# Altium footprint library smd-ipc.PCBLIB: 363 footprints (part 17 of 27)
Each footprint in its own frame and in the unit in brackets; x right, y up, seen from the top. Pads: shape width x height; smd on the part's side, far side on the other; paste and mask are expansions set on the pad; w line width, h text height; cw(c..) or ccw(c..) is an arc to the next point about the centre after c.
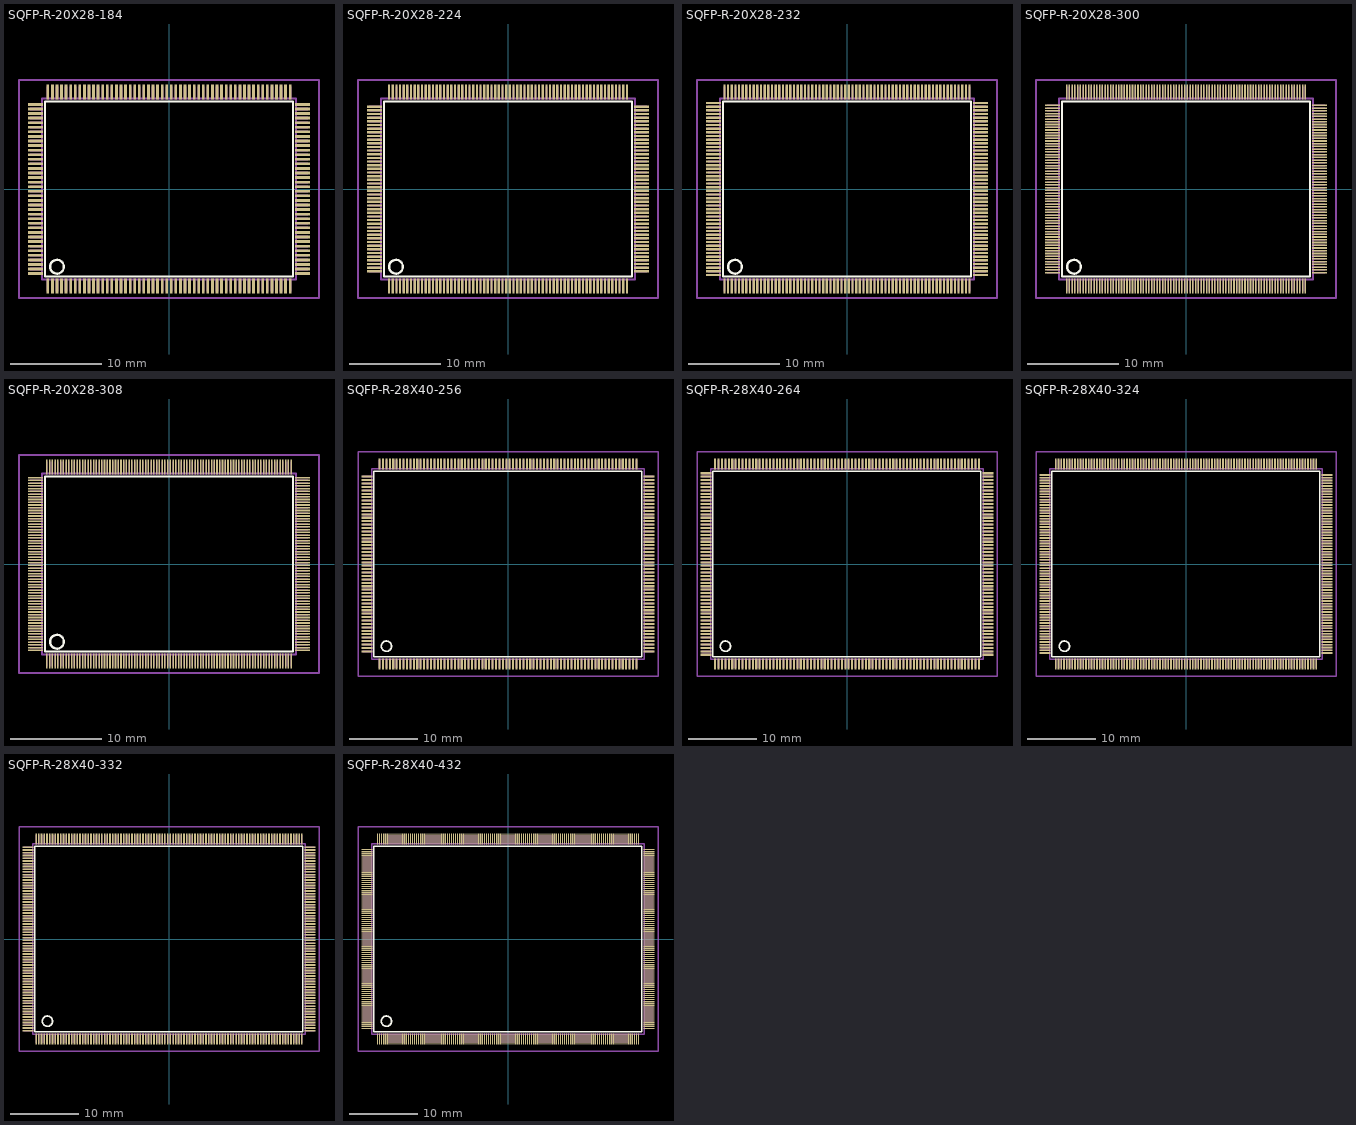
[diagram p16: the footprints below, top view; thin cyan lines are the x and y axes]

## SQFP-R-20X28-184 [mm]
pads (184):
  rect 0.3x1.6 smd: 1(-13.25,-10.6) 2(-12.75,-10.6) 3(-12.25,-10.6) 4(-11.75,-10.6) 5(-11.25,-10.6) 6(-10.75,-10.6) 7(-10.25,-10.6) 8(-9.75,-10.6) 9(-9.25,-10.6) 10(-8.75,-10.6) 11(-8.25,-10.6) 12(-7.75,-10.6) 13(-7.25,-10.6) 14(-6.75,-10.6) 15(-6.25,-10.6) 16(-5.75,-10.6) 17(-5.25,-10.6) 18(-4.75,-10.6) 19(-4.25,-10.6) 20(-3.75,-10.6) 21(-3.25,-10.6) 22(-2.75,-10.6) 23(-2.25,-10.6) 24(-1.75,-10.6) 25(-1.25,-10.6) 26(-0.75,-10.6) 27(-0.25,-10.6) 28(0.25,-10.6) 29(0.75,-10.6) 30(1.25,-10.6) 31(1.75,-10.6) 32(2.25,-10.6) 33(2.75,-10.6) 34(3.25,-10.6) 35(3.75,-10.6) 36(4.25,-10.6) 37(4.75,-10.6) 38(5.25,-10.6) 39(5.75,-10.6) 40(6.25,-10.6) 41(6.75,-10.6) 42(7.25,-10.6) 43(7.75,-10.6) 44(8.25,-10.6) 45(8.75,-10.6) 46(9.25,-10.6) 47(9.75,-10.6) 48(10.25,-10.6) 49(10.75,-10.6) 50(11.25,-10.6) 51(11.75,-10.6) 52(12.25,-10.6) 53(12.75,-10.6) 54(13.25,-10.6) 93(13.25,10.6) 94(12.75,10.6) 95(12.25,10.6) 96(11.75,10.6) 97(11.25,10.6) 98(10.75,10.6) 99(10.25,10.6) 100(9.75,10.6) 101(9.25,10.6) 102(8.75,10.6) 103(8.25,10.6) 104(7.75,10.6) 105(7.25,10.6) 106(6.75,10.6) 107(6.25,10.6) 108(5.75,10.6) 109(5.25,10.6) 110(4.75,10.6) 111(4.25,10.6) 112(3.75,10.6) 113(3.25,10.6) 114(2.75,10.6) 115(2.25,10.6) 116(1.75,10.6) 117(1.25,10.6) 118(0.75,10.6) 119(0.25,10.6) 120(-0.25,10.6) 121(-0.75,10.6) 122(-1.25,10.6) 123(-1.75,10.6) 124(-2.25,10.6) 125(-2.75,10.6) 126(-3.25,10.6) 127(-3.75,10.6) 128(-4.25,10.6) 129(-4.75,10.6) 130(-5.25,10.6) 131(-5.75,10.6) 132(-6.25,10.6) 133(-6.75,10.6) 134(-7.25,10.6) 135(-7.75,10.6) 136(-8.25,10.6) 137(-8.75,10.6) 138(-9.25,10.6) 139(-9.75,10.6) 140(-10.25,10.6) 141(-10.75,10.6) 142(-11.25,10.6) 143(-11.75,10.6) 144(-12.25,10.6) 145(-12.75,10.6) 146(-13.25,10.6)
  rect 1.6x0.3 smd: 55(14.6,-9.25) 56(14.6,-8.75) 57(14.6,-8.25) 58(14.6,-7.75) 59(14.6,-7.25) 60(14.6,-6.75) 61(14.6,-6.25) 62(14.6,-5.75) 63(14.6,-5.25) 64(14.6,-4.75) 65(14.6,-4.25) 66(14.6,-3.75) 67(14.6,-3.25) 68(14.6,-2.75) 69(14.6,-2.25) 70(14.6,-1.75) 71(14.6,-1.25) 72(14.6,-0.75) 73(14.6,-0.25) 74(14.6,0.25) 75(14.6,0.75) 76(14.6,1.25) 77(14.6,1.75) 78(14.6,2.25) 79(14.6,2.75) 80(14.6,3.25) 81(14.6,3.75) 82(14.6,4.25) 83(14.6,4.75) 84(14.6,5.25) 85(14.6,5.75) 86(14.6,6.25) 87(14.6,6.75) 88(14.6,7.25) 89(14.6,7.75) 90(14.6,8.25) 91(14.6,8.75) 92(14.6,9.25) 147(-14.6,9.25) 148(-14.6,8.75) 149(-14.6,8.25) 150(-14.6,7.75) 151(-14.6,7.25) 152(-14.6,6.75) 153(-14.6,6.25) 154(-14.6,5.75) 155(-14.6,5.25) 156(-14.6,4.75) 157(-14.6,4.25) 158(-14.6,3.75) 159(-14.6,3.25) 160(-14.6,2.75) 161(-14.6,2.25) 162(-14.6,1.75) 163(-14.6,1.25) 164(-14.6,0.75) 165(-14.6,0.25) 166(-14.6,-0.25) 167(-14.6,-0.75) 168(-14.6,-1.25) 169(-14.6,-1.75) 170(-14.6,-2.25) 171(-14.6,-2.75) 172(-14.6,-3.25) 173(-14.6,-3.75) 174(-14.6,-4.25) 175(-14.6,-4.75) 176(-14.6,-5.25) 177(-14.6,-5.75) 178(-14.6,-6.25) 179(-14.6,-6.75) 180(-14.6,-7.25) 181(-14.6,-7.75) 182(-14.6,-8.25) 183(-14.6,-8.75) 184(-14.6,-9.25)
Top Overlay:
  circle w0.254: c-12.25,-8.5 r0.75
  lines w0.203: -13.57,-9.56 13.56,-9.56 13.56,9.56 -13.57,9.56 -13.57,-9.56
Mechanical 16:
  drawing of 188 lines, arcs and shapes, not listed
Mechanical 27:
  lines w0.2: -16.4,-11.9 -16.4,11.9 16.4,11.9 16.4,-11.9 -16.4,-11.9

## SQFP-R-20X28-224 [mm]
pads (224):
  rect 0.25x1.6 smd: 1(-13,-10.6) 2(-12.6,-10.6) 3(-12.2,-10.6) 4(-11.8,-10.6) 5(-11.4,-10.6) 6(-11,-10.6) 7(-10.6,-10.6) 8(-10.2,-10.6) 9(-9.8,-10.6) 10(-9.4,-10.6) 11(-9,-10.6) 12(-8.6,-10.6) 13(-8.2,-10.6) 14(-7.8,-10.6) 15(-7.4,-10.6) 16(-7,-10.6) 17(-6.6,-10.6) 18(-6.2,-10.6) 19(-5.8,-10.6) 20(-5.4,-10.6) 21(-5,-10.6) 22(-4.6,-10.6) 23(-4.2,-10.6) 24(-3.8,-10.6) 25(-3.4,-10.6) 26(-3,-10.6) 27(-2.6,-10.6) 28(-2.2,-10.6) 29(-1.8,-10.6) 30(-1.4,-10.6) 31(-1,-10.6) 32(-0.6,-10.6) 33(-0.2,-10.6) 34(0.2,-10.6) 35(0.6,-10.6) 36(1,-10.6) 37(1.4,-10.6) 38(1.8,-10.6) 39(2.2,-10.6) 40(2.6,-10.6) 41(3,-10.6) 42(3.4,-10.6) 43(3.8,-10.6) 44(4.2,-10.6) 45(4.6,-10.6) 46(5,-10.6) 47(5.4,-10.6) 48(5.8,-10.6) 49(6.2,-10.6) 50(6.6,-10.6) 51(7,-10.6) 52(7.4,-10.6) 53(7.8,-10.6) 54(8.2,-10.6) 55(8.6,-10.6) 56(9,-10.6) 57(9.4,-10.6) 58(9.8,-10.6) 59(10.2,-10.6) 60(10.6,-10.6) 61(11,-10.6) 62(11.4,-10.6) 63(11.8,-10.6) 64(12.2,-10.6) 65(12.6,-10.6) 66(13,-10.6) 113(13,10.6) 114(12.6,10.6) 115(12.2,10.6) 116(11.8,10.6) 117(11.4,10.6) 118(11,10.6) 119(10.6,10.6) 120(10.2,10.6) 121(9.8,10.6) 122(9.4,10.6) 123(9,10.6) 124(8.6,10.6) 125(8.2,10.6) 126(7.8,10.6) 127(7.4,10.6) 128(7,10.6) 129(6.6,10.6) 130(6.2,10.6) 131(5.8,10.6) 132(5.4,10.6) 133(5,10.6) 134(4.6,10.6) 135(4.2,10.6) 136(3.8,10.6) 137(3.4,10.6) 138(3,10.6) 139(2.6,10.6) 140(2.2,10.6) 141(1.8,10.6) 142(1.4,10.6) 143(1,10.6) 144(0.6,10.6) 145(0.2,10.6) 146(-0.2,10.6) 147(-0.6,10.6) 148(-1,10.6) 149(-1.4,10.6) 150(-1.8,10.6) 151(-2.2,10.6) 152(-2.6,10.6) 153(-3,10.6) 154(-3.4,10.6) 155(-3.8,10.6) 156(-4.2,10.6) 157(-4.6,10.6) 158(-5,10.6) 159(-5.4,10.6) 160(-5.8,10.6) 161(-6.2,10.6) 162(-6.6,10.6) 163(-7,10.6) 164(-7.4,10.6) 165(-7.8,10.6) 166(-8.2,10.6) 167(-8.6,10.6) 168(-9,10.6) 169(-9.4,10.6) 170(-9.8,10.6) 171(-10.2,10.6) 172(-10.6,10.6) 173(-11,10.6) 174(-11.4,10.6) 175(-11.8,10.6) 176(-12.2,10.6) 177(-12.6,10.6) 178(-13,10.6)
  rect 1.6x0.25 smd: 67(14.6,-9) 68(14.6,-8.6) 69(14.6,-8.2) 70(14.6,-7.8) 71(14.6,-7.4) 72(14.6,-7) 73(14.6,-6.6) 74(14.6,-6.2) 75(14.6,-5.8) 76(14.6,-5.4) 77(14.6,-5) 78(14.6,-4.6) 79(14.6,-4.2) 80(14.6,-3.8) 81(14.6,-3.4) 82(14.6,-3) 83(14.6,-2.6) 84(14.6,-2.2) 85(14.6,-1.8) 86(14.6,-1.4) 87(14.6,-1) 88(14.6,-0.6) 89(14.6,-0.2) 90(14.6,0.2) 91(14.6,0.6) 92(14.6,1) 93(14.6,1.4) 94(14.6,1.8) 95(14.6,2.2) 96(14.6,2.6) 97(14.6,3) 98(14.6,3.4) 99(14.6,3.8) 100(14.6,4.2) 101(14.6,4.6) 102(14.6,5) 103(14.6,5.4) 104(14.6,5.8) 105(14.6,6.2) 106(14.6,6.6) 107(14.6,7) 108(14.6,7.4) 109(14.6,7.8) 110(14.6,8.2) 111(14.6,8.6) 112(14.6,9) 179(-14.6,9) 180(-14.6,8.6) 181(-14.6,8.2) 182(-14.6,7.8) 183(-14.6,7.4) 184(-14.6,7) 185(-14.6,6.6) 186(-14.6,6.2) 187(-14.6,5.8) 188(-14.6,5.4) 189(-14.6,5) 190(-14.6,4.6) 191(-14.6,4.2) 192(-14.6,3.8) 193(-14.6,3.4) 194(-14.6,3) 195(-14.6,2.6) 196(-14.6,2.2) 197(-14.6,1.8) 198(-14.6,1.4) 199(-14.6,1) 200(-14.6,0.6) 201(-14.6,0.2) 202(-14.6,-0.2) 203(-14.6,-0.6) 204(-14.6,-1) 205(-14.6,-1.4) 206(-14.6,-1.8) 207(-14.6,-2.2) 208(-14.6,-2.6) 209(-14.6,-3) 210(-14.6,-3.4) 211(-14.6,-3.8) 212(-14.6,-4.2) 213(-14.6,-4.6) 214(-14.6,-5) 215(-14.6,-5.4) 216(-14.6,-5.8) 217(-14.6,-6.2) 218(-14.6,-6.6) 219(-14.6,-7) 220(-14.6,-7.4) 221(-14.6,-7.8) 222(-14.6,-8.2) 223(-14.6,-8.6) 224(-14.6,-9)
Top Overlay:
  circle w0.254: c-12.25,-8.5 r0.75
  lines w0.203: -13.57,-9.56 13.56,-9.56 13.56,9.56 -13.57,9.56 -13.57,-9.56
Mechanical 16:
  drawing of 228 lines, arcs and shapes, not listed
Mechanical 27:
  lines w0.2: -16.4,-11.9 -16.4,11.9 16.4,11.9 16.4,-11.9 -16.4,-11.9

## SQFP-R-20X28-232 [mm]
pads (232):
  rect 0.25x1.6 smd: 1(-13.4,-10.6) 2(-13,-10.6) 3(-12.6,-10.6) 4(-12.2,-10.6) 5(-11.8,-10.6) 6(-11.4,-10.6) 7(-11,-10.6) 8(-10.6,-10.6) 9(-10.2,-10.6) 10(-9.8,-10.6) 11(-9.4,-10.6) 12(-9,-10.6) 13(-8.6,-10.6) 14(-8.2,-10.6) 15(-7.8,-10.6) 16(-7.4,-10.6) 17(-7,-10.6) 18(-6.6,-10.6) 19(-6.2,-10.6) 20(-5.8,-10.6) 21(-5.4,-10.6) 22(-5,-10.6) 23(-4.6,-10.6) 24(-4.2,-10.6) 25(-3.8,-10.6) 26(-3.4,-10.6) 27(-3,-10.6) 28(-2.6,-10.6) 29(-2.2,-10.6) 30(-1.8,-10.6) 31(-1.4,-10.6) 32(-1,-10.6) 33(-0.6,-10.6) 34(-0.2,-10.6) 35(0.2,-10.6) 36(0.6,-10.6) 37(1,-10.6) 38(1.4,-10.6) 39(1.8,-10.6) 40(2.2,-10.6) 41(2.6,-10.6) 42(3,-10.6) 43(3.4,-10.6) 44(3.8,-10.6) 45(4.2,-10.6) 46(4.6,-10.6) 47(5,-10.6) 48(5.4,-10.6) 49(5.8,-10.6) 50(6.2,-10.6) 51(6.6,-10.6) 52(7,-10.6) 53(7.4,-10.6) 54(7.8,-10.6) 55(8.2,-10.6) 56(8.6,-10.6) 57(9,-10.6) 58(9.4,-10.6) 59(9.8,-10.6) 60(10.2,-10.6) 61(10.6,-10.6) 62(11,-10.6) 63(11.4,-10.6) 64(11.8,-10.6) 65(12.2,-10.6) 66(12.6,-10.6) 67(13,-10.6) 68(13.4,-10.6) 117(13.4,10.6) 118(13,10.6) 119(12.6,10.6) 120(12.2,10.6) 121(11.8,10.6) 122(11.4,10.6) 123(11,10.6) 124(10.6,10.6) 125(10.2,10.6) 126(9.8,10.6) 127(9.4,10.6) 128(9,10.6) 129(8.6,10.6) 130(8.2,10.6) 131(7.8,10.6) 132(7.4,10.6) 133(7,10.6) 134(6.6,10.6) 135(6.2,10.6) 136(5.8,10.6) 137(5.4,10.6) 138(5,10.6) 139(4.6,10.6) 140(4.2,10.6) 141(3.8,10.6) 142(3.4,10.6) 143(3,10.6) 144(2.6,10.6) 145(2.2,10.6) 146(1.8,10.6) 147(1.4,10.6) 148(1,10.6) 149(0.6,10.6) 150(0.2,10.6) 151(-0.2,10.6) 152(-0.6,10.6) 153(-1,10.6) 154(-1.4,10.6) 155(-1.8,10.6) 156(-2.2,10.6) 157(-2.6,10.6) 158(-3,10.6) 159(-3.4,10.6) 160(-3.8,10.6) 161(-4.2,10.6) 162(-4.6,10.6) 163(-5,10.6) 164(-5.4,10.6) 165(-5.8,10.6) 166(-6.2,10.6) 167(-6.6,10.6) 168(-7,10.6) 169(-7.4,10.6) 170(-7.8,10.6) 171(-8.2,10.6) 172(-8.6,10.6) 173(-9,10.6) 174(-9.4,10.6) 175(-9.8,10.6) 176(-10.2,10.6) 177(-10.6,10.6) 178(-11,10.6) 179(-11.4,10.6) 180(-11.8,10.6) 181(-12.2,10.6) 182(-12.6,10.6) 183(-13,10.6) 184(-13.4,10.6)
  rect 1.6x0.25 smd: 69(14.6,-9.4) 70(14.6,-9) 71(14.6,-8.6) 72(14.6,-8.2) 73(14.6,-7.8) 74(14.6,-7.4) 75(14.6,-7) 76(14.6,-6.6) 77(14.6,-6.2) 78(14.6,-5.8) 79(14.6,-5.4) 80(14.6,-5) 81(14.6,-4.6) 82(14.6,-4.2) 83(14.6,-3.8) 84(14.6,-3.4) 85(14.6,-3) 86(14.6,-2.6) 87(14.6,-2.2) 88(14.6,-1.8) 89(14.6,-1.4) 90(14.6,-1) 91(14.6,-0.6) 92(14.6,-0.2) 93(14.6,0.2) 94(14.6,0.6) 95(14.6,1) 96(14.6,1.4) 97(14.6,1.8) 98(14.6,2.2) 99(14.6,2.6) 100(14.6,3) 101(14.6,3.4) 102(14.6,3.8) 103(14.6,4.2) 104(14.6,4.6) 105(14.6,5) 106(14.6,5.4) 107(14.6,5.8) 108(14.6,6.2) 109(14.6,6.6) 110(14.6,7) 111(14.6,7.4) 112(14.6,7.8) 113(14.6,8.2) 114(14.6,8.6) 115(14.6,9) 116(14.6,9.4) 185(-14.6,9.4) 186(-14.6,9) 187(-14.6,8.6) 188(-14.6,8.2) 189(-14.6,7.8) 190(-14.6,7.4) 191(-14.6,7) 192(-14.6,6.6) 193(-14.6,6.2) 194(-14.6,5.8) 195(-14.6,5.4) 196(-14.6,5) 197(-14.6,4.6) 198(-14.6,4.2) 199(-14.6,3.8) 200(-14.6,3.4) 201(-14.6,3) 202(-14.6,2.6) 203(-14.6,2.2) 204(-14.6,1.8) 205(-14.6,1.4) 206(-14.6,1) 207(-14.6,0.6) 208(-14.6,0.2) 209(-14.6,-0.2) 210(-14.6,-0.6) 211(-14.6,-1) 212(-14.6,-1.4) 213(-14.6,-1.8) 214(-14.6,-2.2) 215(-14.6,-2.6) 216(-14.6,-3) 217(-14.6,-3.4) 218(-14.6,-3.8) 219(-14.6,-4.2) 220(-14.6,-4.6) 221(-14.6,-5) 222(-14.6,-5.4) 223(-14.6,-5.8) 224(-14.6,-6.2) 225(-14.6,-6.6) 226(-14.6,-7) 227(-14.6,-7.4) 228(-14.6,-7.8) 229(-14.6,-8.2) 230(-14.6,-8.6) 231(-14.6,-9) 232(-14.6,-9.4)
Top Overlay:
  circle w0.254: c-12.25,-8.5 r0.75
  lines w0.203: -13.57,-9.56 13.56,-9.56 13.56,9.56 -13.57,9.56 -13.57,-9.56
Mechanical 16:
  drawing of 236 lines, arcs and shapes, not listed
Mechanical 27:
  lines w0.2: -16.4,-11.9 -16.4,11.9 16.4,11.9 16.4,-11.9 -16.4,-11.9

## SQFP-R-20X28-300 [mm]
pads (300):
  rect 0.17x1.6 smd: 1(-13.05,-10.6) 2(-12.75,-10.6) 3(-12.45,-10.6) 4(-12.15,-10.6) 5(-11.85,-10.6) 6(-11.55,-10.6) 7(-11.25,-10.6) 8(-10.95,-10.6) 9(-10.65,-10.6) 10(-10.35,-10.6) 11(-10.05,-10.6) 12(-9.75,-10.6) 13(-9.45,-10.6) 14(-9.15,-10.6) 15(-8.85,-10.6) 16(-8.55,-10.6) 17(-8.25,-10.6) 18(-7.95,-10.6) 19(-7.65,-10.6) 20(-7.35,-10.6) 21(-7.05,-10.6) 22(-6.75,-10.6) 23(-6.45,-10.6) 24(-6.15,-10.6) 25(-5.85,-10.6) 26(-5.55,-10.6) 27(-5.25,-10.6) 28(-4.95,-10.6) 29(-4.65,-10.6) 30(-4.35,-10.6) 31(-4.05,-10.6) 32(-3.75,-10.6) 33(-3.45,-10.6) 34(-3.15,-10.6) 35(-2.85,-10.6) 36(-2.55,-10.6) 37(-2.25,-10.6) 38(-1.95,-10.6) 39(-1.65,-10.6) 40(-1.35,-10.6) 41(-1.05,-10.6) 42(-0.75,-10.6) 43(-0.45,-10.6) 44(-0.15,-10.6) 45(0.15,-10.6) 46(0.45,-10.6) 47(0.75,-10.6) 48(1.05,-10.6) 49(1.35,-10.6) 50(1.65,-10.6) 51(1.95,-10.6) 52(2.25,-10.6) 53(2.55,-10.6) 54(2.85,-10.6) 55(3.15,-10.6) 56(3.45,-10.6) 57(3.75,-10.6) 58(4.05,-10.6) 59(4.35,-10.6) 60(4.65,-10.6) 61(4.95,-10.6) 62(5.25,-10.6) 63(5.55,-10.6) 64(5.85,-10.6) 65(6.15,-10.6) 66(6.45,-10.6) 67(6.75,-10.6) 68(7.05,-10.6) 69(11.55,-10.6) 70(7.35,-10.6) 71(7.65,-10.6) 72(7.95,-10.6) 73(8.25,-10.6) 74(8.55,-10.6) 75(8.85,-10.6) 76(9.15,-10.6) 77(9.45,-10.6) 78(9.75,-10.6) 79(10.05,-10.6) 80(10.35,-10.6) 81(10.65,-10.6) 82(10.95,-10.6) 83(11.25,-10.6) 84(11.85,-10.6) 85(12.15,-10.6) 86(12.45,-10.6) 87(12.75,-10.6) 88(13.05,-10.6) 151(13.05,10.6) 152(12.75,10.6) 153(12.45,10.6) 154(12.15,10.6) 155(11.85,10.6) 156(11.55,10.6) 157(11.25,10.6) 158(10.95,10.6) 159(10.65,10.6) 160(10.35,10.6) 161(10.05,10.6) 162(9.75,10.6) 163(9.45,10.6) 164(9.15,10.6) 165(8.85,10.6) 166(8.55,10.6) 167(8.25,10.6) 168(7.95,10.6) 169(7.65,10.6) 170(7.35,10.6) 171(7.05,10.6) 172(6.75,10.6) 173(6.45,10.6) 174(6.15,10.6) 175(5.85,10.6) 176(5.55,10.6) 177(5.25,10.6) 178(4.95,10.6) 179(4.65,10.6) 180(4.35,10.6) 181(4.05,10.6) 182(3.75,10.6) 183(3.45,10.6) 184(3.15,10.6) 185(2.85,10.6) 186(2.55,10.6) 187(2.25,10.6) 188(1.95,10.6) 189(1.65,10.6) 190(1.35,10.6) 191(1.05,10.6) 192(0.75,10.6) 193(0.45,10.6) 194(0.15,10.6) 195(-0.15,10.6) 196(-0.45,10.6) 197(-0.75,10.6) 198(-1.05,10.6) 199(-1.35,10.6) 200(-1.65,10.6) 201(-1.95,10.6) 202(-2.25,10.6) 203(-2.55,10.6) 204(-2.85,10.6) 205(-3.15,10.6) 206(-3.45,10.6) 207(-3.75,10.6) 208(-4.05,10.6) 209(-4.35,10.6) 210(-4.65,10.6) 211(-4.95,10.6) 212(-5.25,10.6) 213(-5.55,10.6) 214(-5.85,10.6) 215(-6.15,10.6) 216(-6.45,10.6) 217(-6.75,10.6) 218(-7.05,10.6) 219(-7.35,10.6) 220(-7.65,10.6) 221(-7.95,10.6) 222(-8.25,10.6) 223(-8.55,10.6) 224(-8.85,10.6) 225(-9.15,10.6) 226(-9.45,10.6) 227(-9.75,10.6) 228(-10.05,10.6) 229(-10.35,10.6) 230(-10.65,10.6) 231(-10.95,10.6) 232(-11.25,10.6) 233(-11.55,10.6) 234(-11.85,10.6) 235(-12.15,10.6) 236(-12.45,10.6) 237(-12.75,10.6) 238(-13.05,10.6)
  rect 1.6x0.17 smd: 89(14.6,-9.15) 90(14.6,-8.85) 91(14.6,-8.55) 92(14.6,-8.25) 93(14.6,-7.95) 94(14.6,-7.65) 95(14.6,-7.35) 96(14.6,-7.05) 97(14.6,-6.75) 98(14.6,-6.45) 99(14.6,-6.15) 100(14.6,-5.85) 101(14.6,-5.55) 102(14.6,-5.25) 103(14.6,-4.95) 104(14.6,-4.65) 105(14.6,-4.35) 106(14.6,-4.05) 107(14.6,-3.75) 108(14.6,-3.45) 109(14.6,-3.15) 110(14.6,-2.85) 111(14.6,-2.55) 112(14.6,-2.25) 113(14.6,-1.95) 114(14.6,-1.65) 115(14.6,-1.35) 116(14.6,-1.05) 117(14.6,-0.75) 118(14.6,-0.45) 119(14.6,-0.15) 120(14.6,0.15) 121(14.6,0.45) 122(14.6,0.75) 123(14.6,1.05) 124(14.6,1.35) 125(14.6,1.65) 126(14.6,1.95) 127(14.6,2.25) 128(14.6,2.55) 129(14.6,2.85) 130(14.6,3.15) 131(14.6,3.45) 132(14.6,3.75) 133(14.6,4.05) 134(14.6,4.35) 135(14.6,4.65) 136(14.6,4.95) 137(14.6,5.25) 138(14.6,5.55) 139(14.6,5.85) 140(14.6,6.15) 141(14.6,6.45) 142(14.6,6.75) 143(14.6,7.05) 144(14.6,7.35) 145(14.6,7.65) 146(14.6,7.95) 147(14.6,8.25) 148(14.6,8.55) 149(14.6,8.85) 150(14.6,9.15) 239(-14.6,9.15) 240(-14.6,8.85) 241(-14.6,8.55) 242(-14.6,8.25) 243(-14.6,7.95) 244(-14.6,7.65) 245(-14.6,7.35) 246(-14.6,7.05) 247(-14.6,6.75) 248(-14.6,6.45) 249(-14.6,6.15) 250(-14.6,5.85) 251(-14.6,5.55) 252(-14.6,5.25) 253(-14.6,4.95) 254(-14.6,4.65) 255(-14.6,4.35) 256(-14.6,4.05) 257(-14.6,3.75) 258(-14.6,3.45) 259(-14.6,3.15) 260(-14.6,2.85) 261(-14.6,2.55) 262(-14.6,2.25) 263(-14.6,1.95) 264(-14.6,1.65) 265(-14.6,1.35) 266(-14.6,1.05) 267(-14.6,0.75) 268(-14.6,0.45) 269(-14.6,0.15) 270(-14.6,-0.15) 271(-14.6,-0.45) 272(-14.6,-0.75) 273(-14.6,-1.05) 274(-14.6,-1.35) 275(-14.6,-1.65) 276(-14.6,-1.95) 277(-14.6,-2.25) 278(-14.6,-2.55) 279(-14.6,-2.85) 280(-14.6,-3.15) 281(-14.6,-3.45) 282(-14.6,-3.75) 283(-14.6,-4.05) 284(-14.6,-4.35) 285(-14.6,-4.65) 286(-14.6,-4.95) 287(-14.6,-5.25) 288(-14.6,-5.55) 289(-14.6,-5.85) 290(-14.6,-6.15) 291(-14.6,-6.45) 292(-14.6,-6.75) 293(-14.6,-7.05) 294(-14.6,-7.35) 295(-14.6,-7.65) 296(-14.6,-7.95) 297(-14.6,-8.25) 298(-14.6,-8.55) 299(-14.6,-8.85) 300(-14.6,-9.15)
Top Overlay:
  circle w0.254: c-12.25,-8.5 r0.75
  lines w0.203: -13.57,-9.56 13.56,-9.56 13.56,9.56 -13.57,9.56 -13.57,-9.56
Mechanical 16:
  drawing of 304 lines, arcs and shapes, not listed
Mechanical 27:
  lines w0.2: -16.4,-11.9 -16.4,11.9 16.4,11.9 16.4,-11.9 -16.4,-11.9

## SQFP-R-20X28-308 [mm]
pads (308):
  rect 0.17x1.6 smd: 1(-13.35,-10.6) 2(-13.05,-10.6) 3(-12.75,-10.6) 4(-12.45,-10.6) 5(-12.15,-10.6) 6(-11.85,-10.6) 7(-11.55,-10.6) 8(-11.25,-10.6) 9(-10.95,-10.6) 10(-10.65,-10.6) 11(-10.35,-10.6) 12(-10.05,-10.6) 13(-9.75,-10.6) 14(-9.45,-10.6) 15(-9.15,-10.6) 16(-8.85,-10.6) 17(-8.55,-10.6) 18(-8.25,-10.6) 19(-7.95,-10.6) 20(-7.65,-10.6) 21(-7.35,-10.6) 22(-7.05,-10.6) 23(-6.75,-10.6) 24(-6.45,-10.6) 25(-6.15,-10.6) 26(-5.85,-10.6) 27(-5.55,-10.6) 28(-5.25,-10.6) 29(-4.95,-10.6) 30(-4.65,-10.6) 31(-4.35,-10.6) 32(-4.05,-10.6) 33(-3.75,-10.6) 34(-3.45,-10.6) 35(-3.15,-10.6) 36(-2.85,-10.6) 37(-2.55,-10.6) 38(-2.25,-10.6) 39(-1.95,-10.6) 40(-1.65,-10.6) 41(-1.35,-10.6) 42(-1.05,-10.6) 43(-0.75,-10.6) 44(-0.45,-10.6) 45(-0.15,-10.6) 46(0.15,-10.6) 47(0.45,-10.6) 48(0.75,-10.6) 49(1.05,-10.6) 50(1.35,-10.6) 51(1.65,-10.6) 52(1.95,-10.6) 53(2.25,-10.6) 54(2.55,-10.6) 55(2.85,-10.6) 56(3.15,-10.6) 57(3.45,-10.6) 58(3.75,-10.6) 59(4.05,-10.6) 60(4.35,-10.6) 61(4.65,-10.6) 62(4.95,-10.6) 63(5.25,-10.6) 64(5.55,-10.6) 65(5.85,-10.6) 66(6.15,-10.6) 67(6.45,-10.6) 68(6.75,-10.6) 69(11.25,-10.6) 70(7.05,-10.6) 71(7.35,-10.6) 72(7.65,-10.6) 73(7.95,-10.6) 74(8.25,-10.6) 75(8.55,-10.6) 76(8.85,-10.6) 77(9.15,-10.6) 78(9.45,-10.6) 79(9.75,-10.6) 80(10.05,-10.6) 81(10.35,-10.6) 82(10.65,-10.6) 83(10.95,-10.6) 84(11.55,-10.6) 85(11.85,-10.6) 86(12.15,-10.6) 87(12.45,-10.6) 88(12.75,-10.6) 89(13.05,-10.6) 90(13.35,-10.6) 155(13.35,10.6) 156(13.05,10.6) 157(12.75,10.6) 158(12.45,10.6) 159(12.15,10.6) 160(11.85,10.6) 161(11.55,10.6) 162(11.25,10.6) 163(10.95,10.6) 164(10.65,10.6) 165(10.35,10.6) 166(10.05,10.6) 167(9.75,10.6) 168(9.45,10.6) 169(9.15,10.6) 170(8.85,10.6) 171(8.55,10.6) 172(8.25,10.6) 173(7.95,10.6) 174(7.65,10.6) 175(7.35,10.6) 176(7.05,10.6) 177(6.75,10.6) 178(6.45,10.6) 179(6.15,10.6) 180(5.85,10.6) 181(5.55,10.6) 182(5.25,10.6) 183(4.95,10.6) 184(4.65,10.6) 185(4.35,10.6) 186(4.05,10.6) 187(3.75,10.6) 188(3.45,10.6) 189(3.15,10.6) 190(2.85,10.6) 191(2.55,10.6) 192(2.25,10.6) 193(1.95,10.6) 194(1.65,10.6) 195(1.35,10.6) 196(1.05,10.6) 197(0.75,10.6) 198(0.45,10.6) 199(0.15,10.6) 200(-0.15,10.6) 201(-0.45,10.6) 202(-0.75,10.6) 203(-1.05,10.6) 204(-1.35,10.6) 205(-1.65,10.6) 206(-1.95,10.6) 207(-2.25,10.6) 208(-2.55,10.6) 209(-2.85,10.6) 210(-3.15,10.6) 211(-3.45,10.6) 212(-3.75,10.6) 213(-4.05,10.6) 214(-4.35,10.6) 215(-4.65,10.6) 216(-4.95,10.6) 217(-5.25,10.6) 218(-5.55,10.6) 219(-5.85,10.6) 220(-6.15,10.6) 221(-6.45,10.6) 222(-6.75,10.6) 223(-7.05,10.6) 224(-7.35,10.6) 225(-7.65,10.6) 226(-7.95,10.6) 227(-8.25,10.6) 228(-8.55,10.6) 229(-8.85,10.6) 230(-9.15,10.6) 231(-9.45,10.6) 232(-9.75,10.6) 233(-10.05,10.6) 234(-10.35,10.6) 235(-10.65,10.6) 236(-10.95,10.6) 237(-11.25,10.6) 238(-11.55,10.6) 239(-11.85,10.6) 240(-12.15,10.6) 241(-12.45,10.6) 242(-12.75,10.6) 243(-13.05,10.6) 244(-13.35,10.6)
  rect 1.6x0.17 smd: 91(14.6,-9.45) 92(14.6,-9.15) 93(14.6,-8.85) 94(14.6,-8.55) 95(14.6,-8.25) 96(14.6,-7.95) 97(14.6,-7.65) 98(14.6,-7.35) 99(14.6,-7.05) 100(14.6,-6.75) 101(14.6,-6.45) 102(14.6,-6.15) 103(14.6,-5.85) 104(14.6,-5.55) 105(14.6,-5.25) 106(14.6,-4.95) 107(14.6,-4.65) 108(14.6,-4.35) 109(14.6,-4.05) 110(14.6,-3.75) 111(14.6,-3.45) 112(14.6,-3.15) 113(14.6,-2.85) 114(14.6,-2.55) 115(14.6,-2.25) 116(14.6,-1.95) 117(14.6,-1.65) 118(14.6,-1.35) 119(14.6,-1.05) 120(14.6,-0.75) 121(14.6,-0.45) 122(14.6,-0.15) 123(14.6,0.15) 124(14.6,0.45) 125(14.6,0.75) 126(14.6,1.05) 127(14.6,1.35) 128(14.6,1.65) 129(14.6,1.95) 130(14.6,2.25) 131(14.6,2.55) 132(14.6,2.85) 133(14.6,3.15) 134(14.6,3.45) 135(14.6,3.75) 136(14.6,4.05) 137(14.6,4.35) 138(14.6,4.65) 139(14.6,4.95) 140(14.6,5.25) 141(14.6,5.55) 142(14.6,5.85) 143(14.6,6.15) 144(14.6,6.45) 145(14.6,6.75) 146(14.6,7.05) 147(14.6,7.35) 148(14.6,7.65) 149(14.6,7.95) 150(14.6,8.25) 151(14.6,8.55) 152(14.6,8.85) 153(14.6,9.15) 154(14.6,9.45) 245(-14.6,9.45) 246(-14.6,9.15) 247(-14.6,8.85) 248(-14.6,8.55) 249(-14.6,8.25) 250(-14.6,7.95) 251(-14.6,7.65) 252(-14.6,7.35) 253(-14.6,7.05) 254(-14.6,6.75) 255(-14.6,6.45) 256(-14.6,6.15) 257(-14.6,5.85) 258(-14.6,5.55) 259(-14.6,5.25) 260(-14.6,4.95) 261(-14.6,4.65) 262(-14.6,4.35) 263(-14.6,4.05) 264(-14.6,3.75) 265(-14.6,3.45) 266(-14.6,3.15) 267(-14.6,2.85) 268(-14.6,2.55) 269(-14.6,2.25) 270(-14.6,1.95) 271(-14.6,1.65) 272(-14.6,1.35) 273(-14.6,1.05) 274(-14.6,0.75) 275(-14.6,0.45) 276(-14.6,0.15) 277(-14.6,-0.15) 278(-14.6,-0.45) 279(-14.6,-0.75) 280(-14.6,-1.05) 281(-14.6,-1.35) 282(-14.6,-1.65) 283(-14.6,-1.95) 284(-14.6,-2.25) 285(-14.6,-2.55) 286(-14.6,-2.85) 287(-14.6,-3.15) 288(-14.6,-3.45) 289(-14.6,-3.75) 290(-14.6,-4.05) 291(-14.6,-4.35) 292(-14.6,-4.65) 293(-14.6,-4.95) 294(-14.6,-5.25) 295(-14.6,-5.55) 296(-14.6,-5.85) 297(-14.6,-6.15) 298(-14.6,-6.45) 299(-14.6,-6.75) 300(-14.6,-7.05) 301(-14.6,-7.35) 302(-14.6,-7.65) 303(-14.6,-7.95) 304(-14.6,-8.25) 305(-14.6,-8.55) 306(-14.6,-8.85) 307(-14.6,-9.15) 308(-14.6,-9.45)
Top Overlay:
  circle w0.254: c-12.25,-8.5 r0.75
  lines w0.203: -13.57,-9.56 13.56,-9.56 13.56,9.56 -13.57,9.56 -13.57,-9.56
Mechanical 16:
  drawing of 312 lines, arcs and shapes, not listed
Mechanical 27:
  lines w0.2: -16.4,-11.9 -16.4,11.9 16.4,11.9 16.4,-11.9 -16.4,-11.9

## SQFP-R-28X40-256 [mil]
pads (256):
  rect 11.81x62.99 smd: 1(-738.19,-574.8) 2(-718.5,-574.8) 3(-698.82,-574.8) 4(-679.13,-574.8) 5(-659.45,-574.8) 6(-639.76,-574.8) 7(-620.08,-574.8) 8(-600.39,-574.8) 9(-580.71,-574.8) 10(-561.02,-574.8) 11(-541.34,-574.8) 12(-521.65,-574.8) 13(-501.97,-574.8) 14(-482.28,-574.8) 15(-462.6,-574.8) 16(-442.91,-574.8) 17(-423.23,-574.8) 18(-403.54,-574.8) 19(-383.86,-574.8) 20(-364.17,-574.8) 21(-344.49,-574.8) 22(-324.8,-574.8) 23(-305.12,-574.8) 24(-285.43,-574.8) 25(-265.75,-574.8) 26(-246.06,-574.8) 27(-226.38,-574.8) 28(-206.69,-574.8) 29(-187.01,-574.8) 30(-167.32,-574.8) 31(-147.64,-574.8) 32(-127.95,-574.8) 33(-108.27,-574.8) 34(-88.58,-574.8) 35(-68.9,-574.8) 36(-49.21,-574.8) 37(-29.53,-574.8) 38(-9.84,-574.8) 39(9.84,-574.8) 40(29.53,-574.8) 41(49.21,-574.8) 42(68.9,-574.8) 43(88.58,-574.8) 44(108.27,-574.8) 45(127.95,-574.8) 46(147.64,-574.8) 47(167.32,-574.8) 48(187.01,-574.8) 49(206.69,-574.8) 50(226.38,-574.8) 51(246.06,-574.8) 52(265.75,-574.8) 53(285.43,-574.8) 54(305.12,-574.8) 55(324.8,-574.8) 56(344.49,-574.8) 57(364.17,-574.8) 58(383.86,-574.8) 59(403.54,-574.8) 60(423.23,-574.8) 61(442.91,-574.8) 62(462.6,-574.8) 63(482.28,-574.8) 64(501.97,-574.8) 65(521.65,-574.8) 66(541.34,-574.8) 67(561.02,-574.8) 68(580.71,-574.8) 69(600.39,-574.8) 70(620.08,-574.8) 71(639.76,-574.8) 72(659.45,-574.8) 73(679.13,-574.8) 74(698.82,-574.8) 75(718.5,-574.8) 76(738.19,-574.8) 129(738.19,574.8) 130(718.5,574.8) 131(698.82,574.8) 132(679.13,574.8) 133(659.45,574.8) 134(639.76,574.8) 135(620.08,574.8) 136(600.39,574.8) 137(580.71,574.8) 138(561.02,574.8) 139(541.34,574.8) 140(521.65,574.8) 141(501.97,574.8) 142(482.28,574.8) 143(462.6,574.8) 144(442.91,574.8) 145(423.23,574.8) 146(403.54,574.8) 147(383.86,574.8) 148(364.17,574.8) 149(344.49,574.8) 150(324.8,574.8) 151(305.12,574.8) 152(285.43,574.8) 153(265.75,574.8) 154(246.06,574.8) 155(226.38,574.8) 156(206.69,574.8) 157(187.01,574.8) 158(167.32,574.8) 159(147.64,574.8) 160(127.95,574.8) 161(108.27,574.8) 162(88.58,574.8) 163(68.9,574.8) 164(49.21,574.8) 165(29.53,574.8) 166(9.84,574.8) 167(-9.84,574.8) 168(-29.53,574.8) 169(-49.21,574.8) 170(-68.9,574.8) 171(-88.58,574.8) 172(-108.27,574.8) 173(-127.95,574.8) 174(-147.64,574.8) 175(-167.32,574.8) 176(-187.01,574.8) 177(-206.69,574.8) 178(-226.38,574.8) 179(-246.06,574.8) 180(-265.75,574.8) 181(-285.43,574.8) 182(-305.12,574.8) 183(-324.8,574.8) 184(-344.49,574.8) 185(-364.17,574.8) 186(-383.86,574.8) 187(-403.54,574.8) 188(-423.23,574.8) 189(-442.91,574.8) 190(-462.6,574.8) 191(-482.28,574.8) 192(-501.97,574.8) 193(-521.65,574.8) 194(-541.34,574.8) 195(-561.02,574.8) 196(-580.71,574.8) 197(-600.39,574.8) 198(-620.08,574.8) 199(-639.76,574.8) 200(-659.45,574.8) 201(-679.13,574.8) 202(-698.82,574.8) 203(-718.5,574.8) 204(-738.19,574.8)